# Altium footprint library My Library.PCBLIB: 198 footprints (part 1 of 13)
Each footprint in its own frame and in the unit in brackets; x right, y up, seen from the top. Pads: shape width x height; smd on the part's side, far side on the other; paste and mask are expansions set on the pad; w line width, h text height; cw(c..) or ccw(c..) is an arc to the next point about the centre after c.
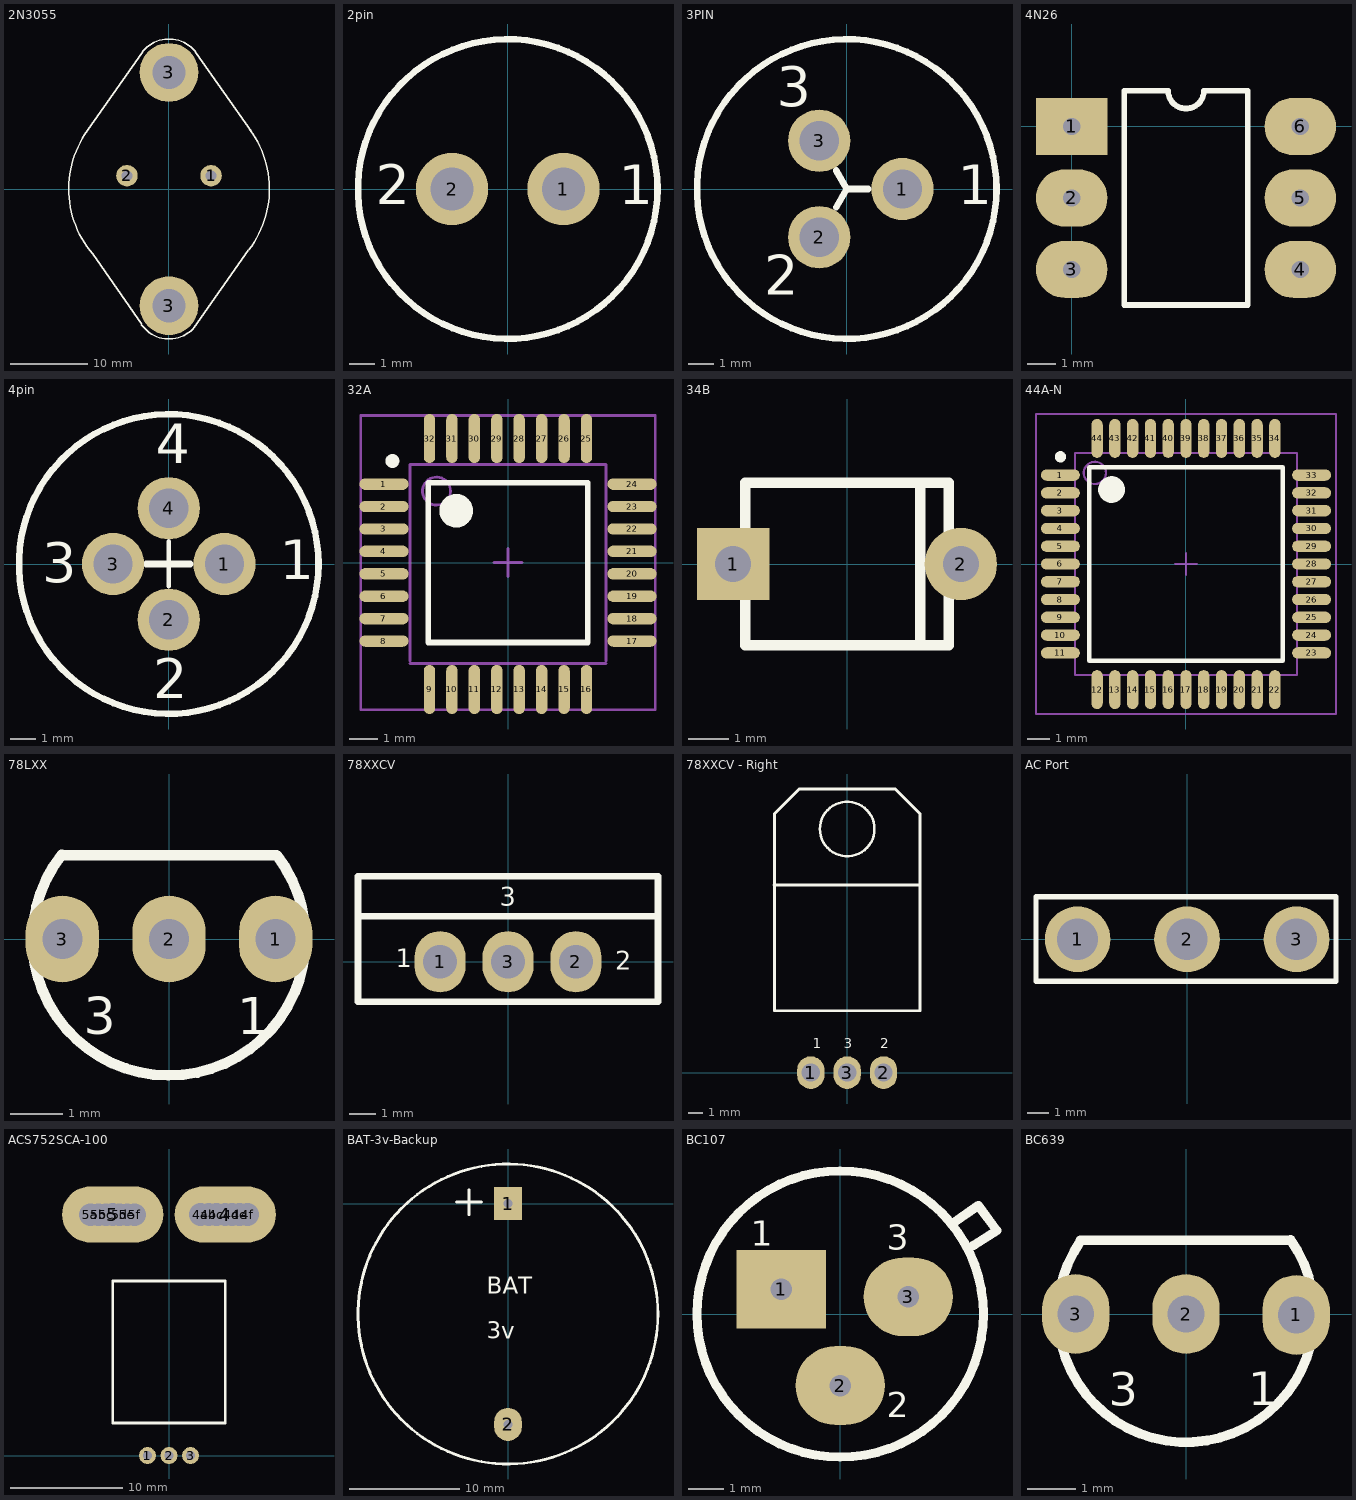
[diagram p0: the footprints below, top view; thin cyan lines are the x and y axes]

## 2N3055 [mil]
pads (4):
  round 110 hole 55: 1(214.5,68) 2(-214.5,68)
  round 300 hole 170: 3(0,-595) 3(0,595)
Top Overlay:
  lines w7: -429.13,279.53 -137.8,692.91 ; -428.85,279.35 ccw(c0,0) -390.26,-331.13 ; -389.76,-330.71 -139.49,-690.96 ; -140.47,-691.64 ccw(c-0.24,-594.22) 129.92,-704.72 404.94,-312.36 ; -138.99,693.76 cw(c0,595) 138.99,693.76 ; 137.8,692.91 418.5,295.91 ; 406.93,-310.52 ccw(c0,0) 412.78,302.7
3D body "2N3055.STEP": height 410.39, standoff -58.11, extent -515.75,-788.51 507.87,757.02
3D body "Heat Sink.STEP": height 1236.69, standoff 30, extent -1126.25,-1122.04 1087.66,1107.41

## 2pin [mil]
pads (2):
  round 110 hole 65: 1(85,0) 2(-85,0)
Top Overlay:
  circle w10: c0,0 r228.35
  text "1" at 169.11,-23.62 h60
  text "2" at -200.97,-23.62 h60
3D body "2PIN1.STEP": height 1185.04, standoff 444.88, extent -297.24,-297.24 297.25,297.25

## 3PIN [mil]
pads (3):
  round 95 hole 60: 1(85,0) 2(-42,-73.49) 3(-42,73.49)
Top Overlay:
  circle w10: c0,0 r228.35
  lines w10: -16.25,28.43 0,0 ; -16,-28 0,0 ; 33,0 0,0
  text "1" at 169.11,-23.62 h60
  text "2" at -126.17,-161.42 h60
  text "3" at -106.48,125.98 h60
3D body "3pin1.STEP": height 653.54, standoff -86.61, extent -299.21,-299.21 295.28,295.28

## 4N26 [mm]
pads (6):
  rect 2.5x2 hole 0.6: 1(0,0)
  oval 2.5x2 hole 0.6: 2(0,-2.5) 3(0,-5) 4(8,-5) 5(8,-2.5) 6(8,0)
Top Overlay:
  lines w0.2: 1.835,-6.25 6.165,-6.25 6.165,1.25 4.625,1.25 cw(c4,1.25) 3.375,1.25 1.835,1.25 1.835,-6.25

## 4pin [mil]
pads (4):
  round 95 hole 60: 1(85,0) 2(0,-85) 3(-85,0) 4(0,85)
Top Overlay:
  circle w10: c0,0 r228.35
  lines w7: 0,-34 0,35
  lines w10: -34,0 33,0
  text "1" at 169.11,-23.62 h60
  text "4" at -19.87,153.54 h60
  text "3" at -193.09,-27.56 h60
  text "2" at -23.8,-204.72 h60
3D body "4PIN1.STEP": height 1185.04, standoff 444.88, extent -297.24,-297.24 297.25,297.25

## 32A [mil] "TQFP, 32-Leads, Body 9.3x9.3mm (max), Pitch 0.80mm, IPC Medium Density"
height 47.24
pads (32):
  oval 69x16 smd: 1(-174.21,110.24) 2(-174.21,78.74) 3(-174.21,47.24) 4(-174.21,15.75) 5(-174.21,-15.75) 6(-174.21,-47.24) 7(-174.21,-78.74) 8(-174.21,-110.24) 17(174.21,-110.24) 18(174.21,-78.74) 19(174.21,-47.24) 20(174.21,-15.75) 21(174.21,15.75) 22(174.21,47.24) 23(174.21,78.74) 24(174.21,110.24)
  oval 16x69 smd: 9(-110.24,-178.15) 10(-78.74,-178.15) 11(-47.24,-178.15) 12(-15.75,-178.15) 13(15.75,-178.15) 14(47.24,-178.15) 15(78.74,-178.15) 16(110.24,-178.15) 25(110.24,174.21) 26(78.74,174.21) 27(47.24,174.21) 28(15.75,174.21) 29(-15.75,174.21) 30(-47.24,174.21) 31(-78.74,174.21) 32(-110.24,174.21)
Top Overlay:
  circle w9.84: c-162.4,142.72 r4.92
  circle w23.62: c-72.83,72.83 r11.81
  lines w7.87: -112.2,-112.2 -112.2,112.2 112.2,112.2 112.2,-112.2 -112.2,-112.2
Mechanical 13:
  circle w3.94: c-100.39,100.39 r19.68
  lines w3.94: -137.8,-141.73 137.8,-141.73 ; -137.8,-137.8 -137.8,137.8 137.8,137.8 137.8,-137.8
Mechanical 15:
  lines w3.94: -19.69,0 19.68,0 ; 0,-19.68 0,19.69 ; -206.69,-206.69 -206.69,206.69 206.69,206.69 206.69,-206.69 -206.69,-206.69
3D body "32A.STEP": height 43.7, standoff 0, extent -188.98,-188.98 188.98,188.98

## 34B [mil]
pads (2):
  rect 70x70 hole 35: 1(-110.24,0)
  round 70 hole 35: 2(110.24,0)
Top Overlay:
  lines w10: 70.87,-78.74 70.87,78.74 ; -98.43,-78.74 -98.43,78.74 98.43,78.74 98.43,-78.74 -98.43,-78.74
3D body: height 111.42, standoff 95.47, extent -78.74,-66.93 78.74,66.93
3D body "BPW34B.STEP": height 112.2, standoff -99.03, extent -120.53,-78.74 120.53,78.74

## 44A-N [mm] "Thin QFP, 44-Leads, Body 10x10mm, Pitch 0.8mm, IPC Medium Density"
height 1.2
pads (44):
  oval 1.75x0.508 smd: 1(-5.65,4) 2(-5.65,3.2) 3(-5.65,2.4) 4(-5.65,1.6) 5(-5.65,0.8) 6(-5.65,0) 7(-5.65,-0.8) 8(-5.65,-1.6) 9(-5.65,-2.4) 10(-5.65,-3.2) 11(-5.65,-4) 23(5.65,-4) 24(5.65,-3.2) 25(5.65,-2.4) 26(5.65,-1.6) 27(5.65,-0.8) 28(5.65,0) 29(5.65,0.8) 30(5.65,1.6) 31(5.65,2.4) 32(5.65,3.2) 33(5.65,4)
  oval 0.508x1.75 smd: 12(-4,-5.65) 13(-3.2,-5.65) 14(-2.4,-5.65) 15(-1.6,-5.65) 16(-0.8,-5.65) 17(0,-5.65) 18(0.8,-5.65) 19(1.6,-5.65) 20(2.4,-5.65) 21(3.2,-5.65) 22(4,-5.65) 34(4,5.65) 35(3.2,5.65) 36(2.4,5.65) 37(1.6,5.65) 38(0.8,5.65) 39(0,5.65) 40(-0.8,5.65) 41(-1.6,5.65) 42(-2.4,5.65) 43(-3.2,5.65) 44(-4,5.65)
Top Overlay:
  circle w0.6: c-3.35,3.35 r0.3
  circle w0.25: c-5.65,4.825 r0.125
  lines w0.2: -4.35,-4.35 4.35,-4.35 4.35,4.35 -4.35,4.35 -4.35,-4.35
Mechanical 13:
  circle w0.1: c-4.1,4.1 r0.5
  lines w0.1: -5,-5 5,-5 5,5 -5,5 -5,-5
Mechanical 15:
  lines w0.1: -0.5,0 0.5,0 ; 0,-0.5 0,0.5 ; -6.75,-6.75 6.75,-6.75 6.75,6.75 -6.75,6.75 -6.75,-6.75
3D body "ATMEL-TQFP44-1.STEP": height 1.1, standoff 0, extent -6.02,-5.994 5.998,6.023

## 78LXX [mil]
height 236.22
pads (3):
  oval 55x65 hole 30: 1(80,0) 2(0,0) 3(-80,0)
Top Overlay:
  lines w7.87: -80.54,63.17 ccw(c0,0) 81.13,62.41 80.55,62.99 -80.31,62.99
  text "1" at 51,-71.26 h27.56
  text "3" at -64,-71.26 h27.56
3D body "SW3dPS-TO-92A.STEP": height 314.96, standoff -118.11, extent -97.49,-90.72 91.49,64

## 78XXCV [mil]
pads (3):
  oval 75x90 hole 50: 1(-100,0) 2(100,0) 3(0,0)
Top Overlay:
  lines w10: -220.73,66.93 220.73,66.93 ; -220.73,-58.86 220.73,-58.86 220.73,125.79 -220.73,125.79 -220.73,-58.86
  text "3" at -11.81,82.68 h27.56
  text "2" at 157.48,-11.81 h27.56
  text "1" at -165.35,-7.87 h27.56
3D body "SW3dPS-TO220AB.step": height 780.71, standoff -137.8, extent -220.73,-58.86 220.73,125.79

## 78XXCV - Right [mil] "Right Angle"
height 177.17
pads (3):
  oval 75x90 hole 50: 1(-100,0) 2(100,0) 3(0,0)
Top Overlay:
  circle w7: c0,670 r75
  lines w7.87: -201,516.22 199,516.22 ; -200,170 200,170 200,712 132,780 -132,780 -200,712 -200,578.74 -200,170
  text "1" at -95,66.93 h27.56
  text "2" at 91,66.93 h27.56
  text "3" at -10,66.93 h27.56
3D body "78XXCV.STEP": height 175, standoff -112.5, extent -198,-8 202,776

## AC Port [mil]
pads (3):
  round 120 hole 75: 1(-200,0) 2(0,0) 3(200,0)
Top Overlay:
  lines w10: -276,-77 272,-77 272,78 -276,78 -276,-77
3D body: height 50, standoff -30, extent 170.87,-29.98 230.83,29.98
3D body: height 200, standoff 30, extent 138.87,-61.98 262.83,61.98
3D body: height 50, standoff -30, extent -29.98,-29.98 29.98,29.98
3D body: height 200, standoff 30, extent -61.98,-61.98 61.98,61.98
3D body: height 200, standoff 30, extent -261.83,-61.98 -137.87,61.98
3D body: height 50, standoff -30, extent -229.83,-29.98 -169.87,29.98

## ACS752SCA-100 [mil]
height 295.28
pads (17):
  round 59.06 hole 31.5: 1(-75.2,0) 2(0,0) 3(75.2,0)
  oval 353.63x196.63 hole 80: 4(196.85,842.52) 5(-196.85,842.52)
  round 70 hole 80: 4a(110.78,842.52) 4b(139,842.52) 4c(165.52,842.52) 4d(220.26,842.52) 4e(247,842.52) 4f(275,842.52) 5a(-275,842) 5b(-246,842) 5c(-220,842) 5d(-173,842) 5e(-146,842) 5f(-120,842)
Top Overlay:
  lines w10: -196.85,114.17 -196.85,610.24 196.85,610.24 196.85,114.17 -196.85,114.17
3D body: height 174.41, standoff 159.45, extent -85.04,-7.48 -65.35,114.17
3D body: height 174.41, standoff 159.45, extent -9.84,-7.48 9.84,114.17
3D body: height 174.41, standoff 159.45, extent 65.35,-7.48 85.04,114.17
3D body: height 159.45, standoff -118.11, extent 65.35,-7.48 85.04,7.48
3D body: height 159.45, standoff -118.11, extent -85.04,-7.48 -65.35,7.48
3D body: height 118.11, standoff -125.98, extent 116.14,811.02 277.56,874.02
3D body: height 118.11, standoff -125.98, extent -277.56,811.02 -116.14,874.02
3D body: height 177.17, standoff 118.11, extent 116.14,283.46 277.56,874.02
3D body: height 177.17, standoff 118.11, extent -277.56,283.46 -116.14,874.02
3D body: height 287.4, standoff 11.81, extent -196.85,114.17 196.85,610.24
3D body: height 159.45, standoff -118.11, extent -9.84,-7.48 9.84,7.48

## BAT-3v-Backup [mm]
pads (2):
  rect 2.5x3 hole 0.8: 1(0,0)
  oval 2.5x3 hole 0.8: 2(0,-20)
Top Overlay:
  circle w0.254: c0,-10 r13.58
  lines w0.254: -4.67,0.14 -2.41,0.14 ; -3.52,-1.01 -3.52,1.25
  text "3v" at -1.905,-12.25 h1.52
  text "BAT" at -1.905,-8.18 h1.52

## BC107 [mm]
pads (3):
  rect 2.5x2.2 hole 0.6: 1(-1.64,0.69)
  oval 2.5x2.2 hole 0.6: 2(0,-2) 3(1.9,0.48)
Top Overlay:
  circle w0.254: c0,0 r4
  lines w0.254: 3.14,2.54 3.86,3.03 4.38,2.33 3.73,1.92
  text "2" at 1.295,-2.88 h0.7
  text "1" at -2.5,1.9 h0.7
  text "3" at 1.295,1.79 h0.7

## BC639 [mil] "NPN Transistorq"
height 322.83
pads (3):
  oval 55x65 hole 30: 1(90,-0.79) 2(0,0) 3(-90,0)
Top Overlay:
  lines w7.87: -86.22,60.24 84.65,60.24 ; -85.85,59.98 ccw(c0,0) 85.32,60.72
  text "1" at 51,-74.41 h27.56
  text "3" at -62.99,-74.8 h27.56
3D body "SW3dPS-TO-92A.STEP": height 314.96, standoff -118.11, extent -90.55,-94.49 98.43,60.24